# Altium footprint library Atlan.PcbLib: 283 footprints (part 3 of 18)
Each footprint in its own frame and in the unit in brackets; x right, y up, seen from the top. Pads: shape width x height; smd on the part's side, far side on the other; paste and mask are expansions set on the pad; w line width, h text height; cw(c..) or ccw(c..) is an arc to the next point about the centre after c.
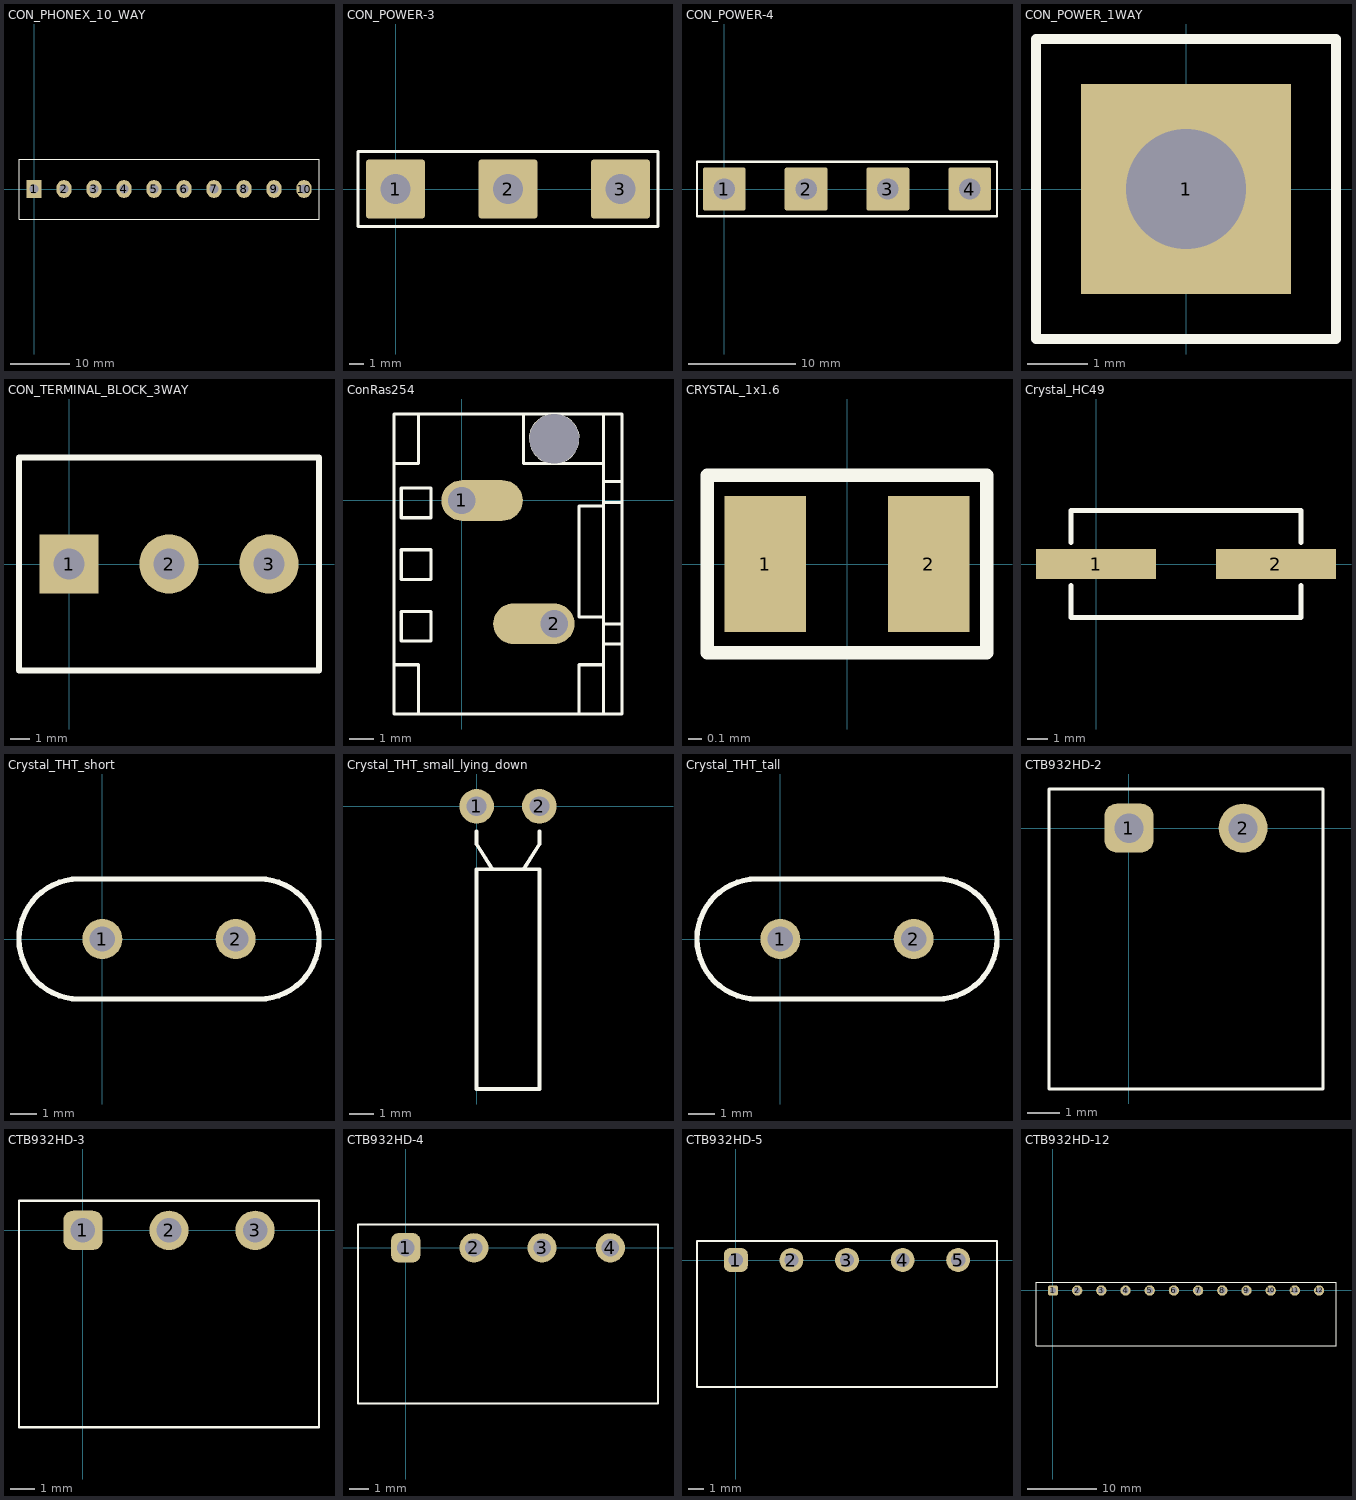
[diagram p2: the footprints below, top view; thin cyan lines are the x and y axes]

## CON_PHONEX_10_WAY [mm]
height 10
pads (10):
  rect 2.6x3 hole 1.6: 1(0,0)
  oval 2.6x3 hole 1.6: 2(5.08,0) 3(10.16,0) 4(15.24,0) 5(20.32,0) 6(25.4,0) 7(30.48,0) 8(35.56,0) 9(40.64,0) 10(45.72,0)
Top Overlay:
  lines w0.2: -2.54,-5.08 22.86,-5.08 48.26,-5.08 48.26,5.08 -2.54,5.08 -2.54,-5.08

## CON_POWER-3 [mm]
pads (3):
  rrect10% 4x4 hole 2: 1(0,0) 2(7.62,0) 3(15.24,0)
Top Overlay:
  lines w0.2: -2.54,-2.54 17.78,-2.54 17.78,2.54 -2.54,2.54 -2.54,-2.54

## CON_POWER-4 [mm]
pads (4):
  rrect10% 4x4 hole 2: 1(0,0) 2(7.62,0) 3(15.24,0) 4(22.86,0)
Top Overlay:
  lines w0.2: -2.54,-2.54 -2.54,2.54 25.4,2.54 25.4,-2.54 -2.54,-2.54

## CON_POWER_1WAY [mm]
pads (1):
  rect 3.5x3.5 hole 2: 1(0,0)
Top Overlay:
  lines w0.17: -2.5,-2.5 -2.5,2.5 2.5,2.5 2.5,-2.5 -2.5,-2.5

## CON_TERMINAL_BLOCK_3WAY [mm] "Wire-To-Board Terminal Block, 5.08 mm, 3 Ways, 26 AWG, 12 AWG, Screw"
height 14
pads (3):
  rect 3x3 hole 1.6: 1(0,0)
  round 3 hole 1.6: 2(5.08,0) 3(10.16,0)
Top Overlay:
  lines w0.3: -2.54,-5.4 12.7,-5.4 12.7,5.4 -2.54,5.4 -2.54,-5.4
3D body: height 14, standoff 0, extent -2.5,-5.4 12.7,5.4

## ConRas254 [mm]
pads (3):
  oval 3.3x1.65 hole 1.1 copper offset 0.825,0: 1(0,0)
  oval 3.3x1.65 hole 1.1 copper offset -0.825,0: 2(3.749,-4.999)
  round 2 hole 2 unplated: ""(3.746,2.505)
Top Overlay:
  lines w0: 2.748,2.499 2.753,2.4 2.769,2.301 2.794,2.205 2.827,2.111 2.87,2.022 2.921,1.935 2.982,1.857 3.051,1.783 3.124,1.717 3.205,1.659 3.292,1.608 3.383,1.567 3.477,1.537 3.576,1.514 3.675,1.501 3.774,1.499 3.873,1.506 3.973,1.524 4.067,1.552 4.161,1.587 4.249,1.633 4.333,1.687 4.412,1.75 4.483,1.819 4.547,1.895 4.602,1.979 4.651,2.065 4.689,2.156 4.719,2.253 4.74,2.349 4.75,2.449 4.75,2.55 4.74,2.649 4.719,2.746 4.689,2.842 4.651,2.934 4.602,3.02 4.547,3.104 4.483,3.18 4.412,3.249 4.333,3.312 4.249,3.365 4.161,3.411 4.067,3.447 3.973,3.475 3.873,3.492 3.774,3.5 3.675,3.498 3.576,3.485 3.477,3.462 3.383,3.432 3.292,3.391 3.205,3.34 3.124,3.282 3.051,3.216 2.982,3.142 2.921,3.063 2.87,2.977 2.827,2.888 2.794,2.794 2.769,2.697 2.753,2.598 2.748,2.499
  lines w0.127: -2.751,-6.657 -2.751,-8.656 -1.75,-8.656 ; -2.751,-6.657 -1.75,-6.657 -1.75,-8.656 ; -2.751,-6.657 -2.751,1.501 ; -2.751,1.501 -2.751,3.5 -1.75,3.5 ; -2.751,1.501 -1.75,1.501 -1.75,3.5 ; -1.75,-8.656 4.75,-8.656 ; -1.75,3.5 2.499,3.5 ; 2.499,3.5 5.751,3.5 ; 2.499,3.5 2.499,1.501 5.751,1.501 ; 4.75,-8.656 5.751,-8.656 ; 4.75,-8.656 4.75,-6.657 5.751,-6.657 ; 5.751,-8.656 5.751,-6.657 ; 5.751,-8.656 6.5,-8.656 6.5,-5.819 ; 5.751,-6.657 5.751,-5.819 ; 5.751,-5.819 5.751,-5.009 ; 5.751,-5.819 6.5,-5.819 ; 5.751,-5.009 5.751,-4.729 ; 5.751,-5.009 6.5,-5.009 ; 5.751,-4.729 5.751,-0.229 ; 5.751,-4.729 4.75,-4.729 4.75,-0.229 5.751,-0.229 ; 5.751,-0.229 5.751,-0.079 ; 5.751,-0.079 5.751,0.77 ; 5.751,-0.079 6.5,-0.079 ; 5.751,0.77 5.751,1.501 ; 5.751,0.77 6.5,0.77 ; 5.751,1.501 5.751,3.5 ; 5.751,3.5 6.5,3.5 6.5,0.77 ; 6.5,-5.819 6.5,-5.009 ; 6.5,-5.009 6.5,-0.079 ; 6.5,-0.079 6.5,0.77 ; -2.451,-5.7 -2.451,-4.501 -1.25,-4.501 -1.25,-5.7 -2.451,-5.7 ; -2.451,-3.2 -2.451,-1.999 -1.25,-1.999 -1.25,-3.2 -2.451,-3.2 ; -2.451,-0.699 -2.451,0.5 -1.25,0.5 -1.25,-0.699 -2.451,-0.699

## CRYSTAL_1x1.6 [mm]
height 0.5
pads (2):
  rect 0.6x1 smd mask+0.04: 1(-0.6,0) 2(0.6,0)
Top Overlay:
  lines w0.1: -1.025,-0.65 1.025,-0.65 1.025,0.65 -1.025,0.65 -1.025,-0.65

## Crystal_HC49 [mm] "Crystall SMD short HC49"
height 4
pads (2):
  rect 6x1.5 smd: 1(0,0) 2(8.999,0)
Top Overlay:
  lines w0.254: -1.251,-1.079 -1.251,-2.667 10.25,-2.667 10.25,-1.079 ; -1.251,1.079 -1.251,2.667 10.25,2.667 10.25,1.079
3D body "User Library-hc49_cystal.step": height 5.08, standoff 0, extent -2.128,-2.413 11.272,2.487

## Crystal_THT_short [mil] "Crystal short THT"
height 157.48
pads (2):
  round 60 hole 38: 1(0,0) 2(200,0)
Top Overlay:
  lines w8: -35,-90 cw(c-35,0) -35,90 235,90 cw(c235,0) 235,-90 -35,-90
3D body "User Library-HP49US.step": height 138.4, standoff -156.88, extent -123.43,-90 323.43,93.07

## Crystal_THT_small_lying_down [mm]
pads (2):
  round 1.4 hole 0.8: 1(0,0) 2(2.54,0)
Top Overlay:
  lines w0.15: 0,-1.016 0,-1.524 0.635,-2.54 ; 1.905,-2.54 2.54,-1.524 2.54,-1.016 ; 0,-11.43 0,-2.54 2.54,-2.54 2.54,-11.43 0,-11.43

## Crystal_THT_tall [mil] "Crystal tall THT"
height 551.18
pads (2):
  round 60 hole 38: 1(0,0) 2(200,0)
Top Overlay:
  lines w8: -35,-90 cw(c-35,0) -35,90 235,90 cw(c235,0) 235,-90 -35,-90
3D body "User Library-Crystal_V2009.step": height 505.91, standoff -78.74, extent -112.6,-85 312.6,88.23

## CTB932HD-2 [mm]
height 7
pads (2):
  rrect50% 1.5x1.5 hole 0.9: 1(0,0)
  round 1.5 hole 0.9: 2(3.5,0)
Top Overlay:
  lines w0.1: -2.45,-8 5.95,-8 5.95,1.2 -2.45,1.2 -2.45,-8
3D body: height 7, standoff 0, extent -2.45,-8 5.95,1.2

## CTB932HD-3 [mm]
height 7
pads (3):
  rrect50% 1.6x1.6 hole 1: 1(0,0)
  round 1.6 hole 1: 2(3.5,0) 3(7,0)
Top Overlay:
  lines w0.1: -2.6,-8 -2.6,1.2 9.6,1.2 9.6,-8 -2.6,-8
3D body: height 7, standoff 0, extent -2.6,-8 9.6,1.2

## CTB932HD-4 [mm]
height 7
pads (4):
  rrect50% 1.5x1.5 hole 0.9: 1(0,0)
  round 1.5 hole 0.9: 2(3.5,0) 3(7,0) 4(10.5,0)
Top Overlay:
  lines w0.1: -2.45,-8 12.95,-8 12.95,1.2 -2.45,1.2 -2.45,-8
3D body: height 7, standoff 0, extent -2.45,-8 12.95,1.2

## CTB932HD-5 [mm]
pads (5):
  rrect50% 1.5x1.5 hole 0.9: 1(0,0)
  round 1.5 hole 0.9: 2(3.5,0) 3(7,0) 4(10.5,0) 5(14,0)
Top Overlay:
  lines w0.1: -2.45,-8 16.45,-8 16.45,1.2 -2.45,1.2 -2.45,-8
3D body: height 7, standoff 0, extent -2.45,-8 16.45,1.2

## CTB932HD-12 [mm]
pads (12):
  rrect50% 1.5x1.5 hole 0.9: 1(0,0)
  round 1.5 hole 0.9: 2(3.5,0) 3(7,0) 4(10.5,0) 5(14,0) 6(17.5,0) 7(21,0) 8(24.5,0) 9(28,0) 10(31.5,0) 11(35,0) 12(38.5,0)
Top Overlay:
  lines w0.1: -2.45,-8 -2.45,1.2 40.95,1.2 40.95,-8 -2.45,-8
3D body: height 7, standoff 0, extent -2.45,-8 40.95,1.2